# Altium footprint library Item_pcb.PcbLib: 282 footprints (part 13 of 18)
Each footprint in its own frame and in the unit in brackets; x right, y up, seen from the top. Pads: shape width x height; smd on the part's side, far side on the other; paste and mask are expansions set on the pad; w line width, h text height; cw(c..) or ccw(c..) is an arc to the next point about the centre after c.
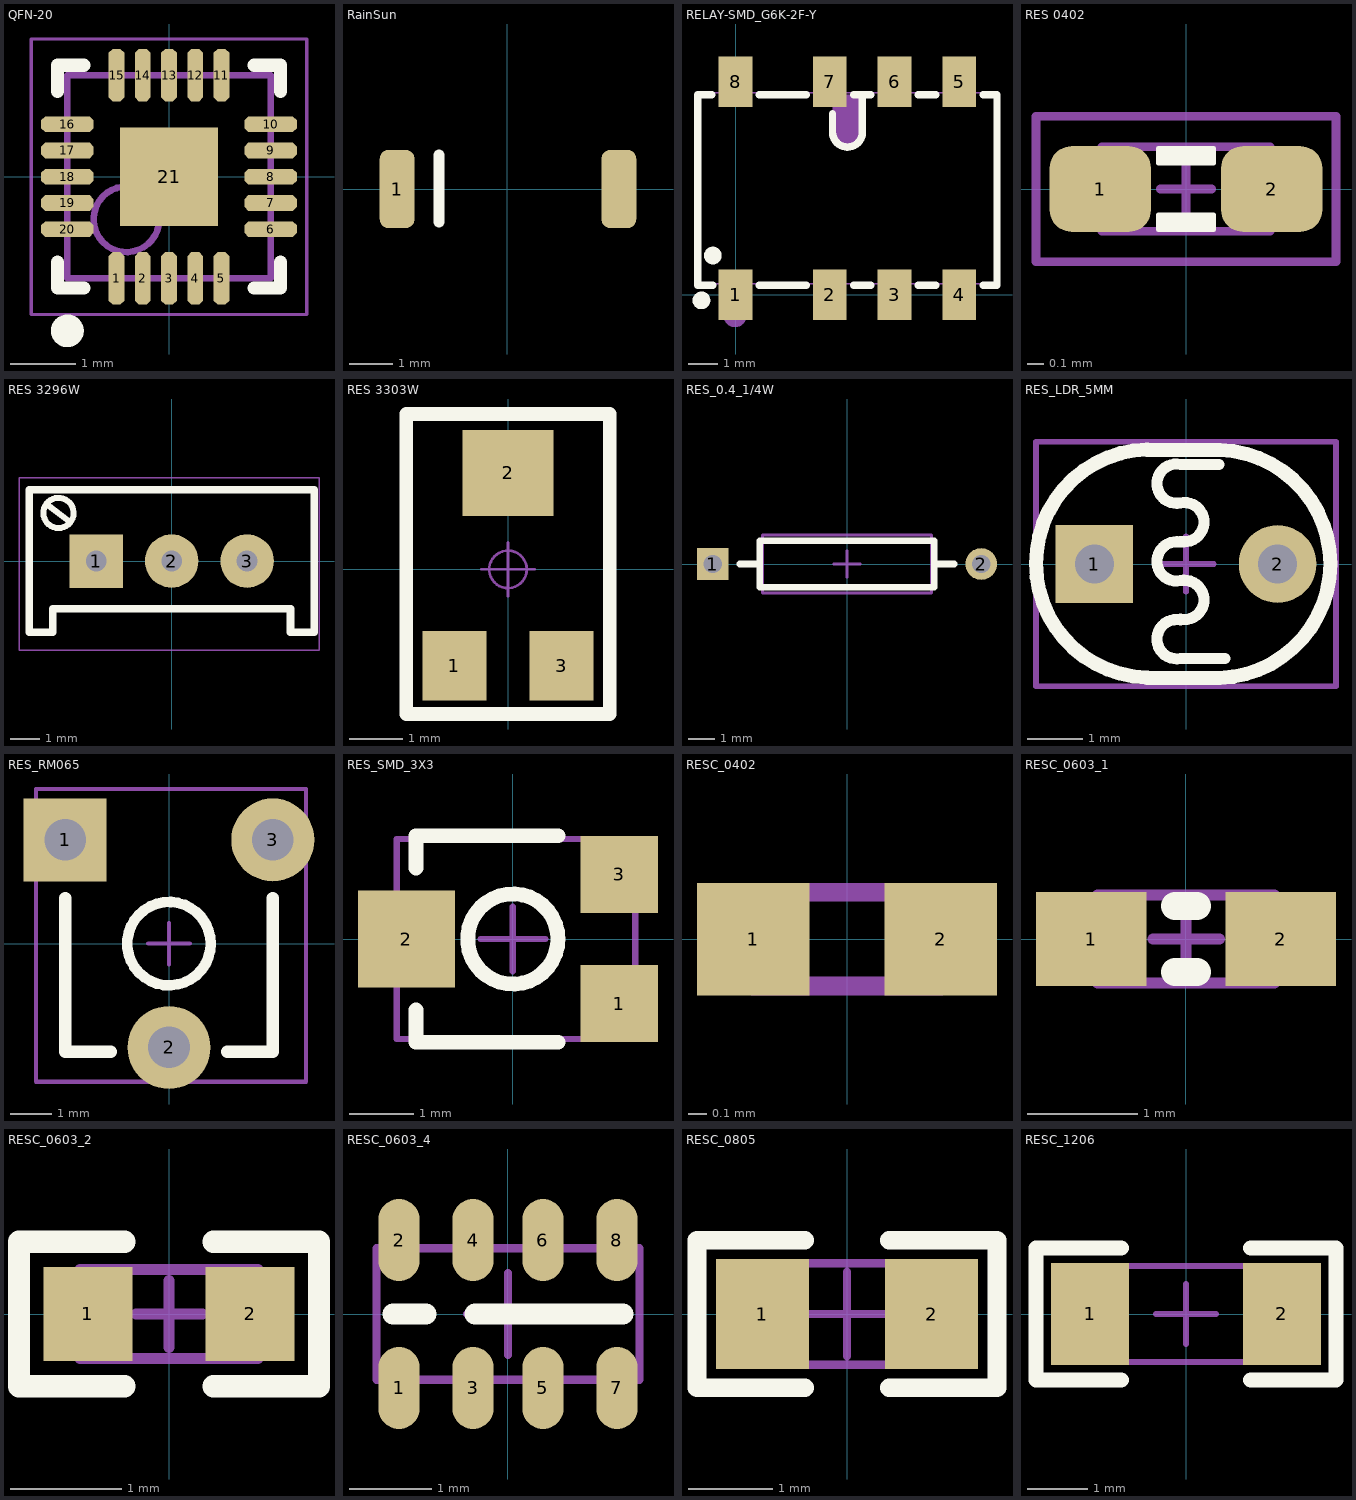
[diagram p12: the footprints below, top view; thin cyan lines are the x and y axes]

## QFN-20 [mm] "3*3MM"
pads (21):
  oct 0.24x0.8 smd: 1(-0.8,-1.55) 2(-0.4,-1.55) 3(0,-1.55) 4(0.4,-1.55) 5(0.8,-1.55) 11(0.8,1.55) 12(0.4,1.55) 13(0,1.55) 14(-0.4,1.55) 15(-0.8,1.55)
  oct 0.8x0.24 smd: 6(1.55,-0.8) 7(1.55,-0.4) 8(1.55,0) 9(1.55,0.4) 10(1.55,0.8) 16(-1.55,0.8) 17(-1.55,0.4) 18(-1.55,0) 19(-1.55,-0.4) 20(-1.55,-0.8)
  rect 1.5x1.5 smd: 21(0,0)
Top Overlay:
  circle w0.25: c-1.55,-2.35 r0.125
  lines w0.2: -1.7,-1.3 -1.7,-1.7 -1.3,-1.7 ; -1.7,1.3 -1.7,1.7 -1.3,1.7 ; 1.3,-1.7 1.7,-1.7 1.7,-1.3 ; 1.3,1.7 1.7,1.7 1.7,1.3
Mechanical 13:
  circle w0.1: c-0.65,-0.65 r0.5
  lines w0.1: -1.55,-1.55 -1.55,1.55 1.55,1.55 1.55,-1.55 -1.55,-1.55
Mechanical 15:
  lines w0.05: -2.1,-2.1 -2.1,2.1 2.1,2.1 2.1,-2.1 -2.1,-2.1
  lines w0.1: -0.5,0 0.5,0 ; 0,-0.5 0,0.5
3D body "QFN40P300X300X80_HS-21N.step": height 0.8, standoff 0, extent -1.56,-1.56 1.56,1.56

## RainSun [mm] "天线"
pads (2):
  rrect50% 0.8x1.8 smd: 1(-2.54,0) ""(2.563,0)
Top Overlay:
  lines w0.254: -1.575,-0.762 -1.575,0.788
3D body "123.stp": height 1.32, standoff -0.01, extent -2.573,-0.911 2.542,0.935

## RELAY-SMD_G6K-2F-Y [mm] "JDQ"
pads (8):
  rect 1.15x1.7 smd: 1(0,0) 2(3.2,0) 3(5.4,0) 4(7.6,0) 5(7.6,7.235) 6(5.4,7.235) 7(3.2,7.235) 8(0,7.235)
Top Overlay:
  circle w0.3: c-1.161,-0.192 r0.15
  circle w0.3: c-0.772,1.332 r0.15
  lines w0.254: -0.806,6.793 -1.28,6.793 -1.28,0.443 -1.28,0.316 -0.772,0.316 ; 0.806,0.316 2.394,0.316 ; 0.806,6.793 2.394,6.793 ; 3.292,6.154 3.292,5.523 ccw(c3.8,5.523) 3.8,5.015 ccw(c3.8,5.523) 4.308,5.523 4.308,6.666 ; 4.006,0.316 4.594,0.316 ; 4.006,6.793 4.594,6.793 ; 6.206,0.316 6.794,0.316 ; 6.206,6.793 6.794,6.793 ; 8.406,0.316 8.88,0.316 8.88,6.793 8.406,6.793
Mechanical 6:
  circle w0.4: c-0.018,-0.7 r0.2
  region: 3.8,5.015 3.699,5.015 3.512,5.092 3.369,5.235 3.292,5.422 3.292,5.523 3.292,6.793 4.308,6.793 4.308,5.523 4.308,5.422 4.231,5.235 4.088,5.092 3.901,5.015
Mechanical 15:
  region: -0.25,-0.282 -0.25,0.218 0.25,0.218 0.25,-0.282
  region: -0.25,0.208 -0.25,0.378 0.25,0.378 0.25,0.208
  region: 2.95,-0.282 2.95,0.218 3.45,0.218 3.45,-0.282
  region: 2.95,0.208 2.95,0.378 3.45,0.378 3.45,0.208
  region: 5.15,-0.282 5.15,0.218 5.65,0.218 5.65,-0.282
  region: 5.15,0.208 5.15,0.378 5.65,0.378 5.65,0.208
  region: 7.35,-0.282 7.35,0.218 7.85,0.218 7.85,-0.282
  region: 7.35,0.208 7.35,0.378 7.85,0.378 7.85,0.208
  region: -0.25,7.018 -0.25,7.518 0.25,7.518 0.25,7.018
  region: -0.25,6.858 -0.25,7.028 0.25,7.028 0.25,6.858
  region: 2.95,7.018 2.95,7.518 3.45,7.518 3.45,7.018
  region: 2.95,6.858 2.95,7.028 3.45,7.028 3.45,6.858
  region: 5.15,7.018 5.15,7.518 5.65,7.518 5.65,7.018
  region: 5.15,6.858 5.15,7.028 5.65,7.028 5.65,6.858
  region: 7.35,7.018 7.35,7.518 7.85,7.518 7.85,7.018
  region: 7.35,6.858 7.35,7.028 7.85,7.028 7.85,6.858
  region: -1.14,-0.282 -1.141,-0.258 -1.176,-0.224 -1.225,-0.224 -1.259,-0.258 -1.26,-0.282 -1.259,-0.307 -1.224,-0.341 -1.175,-0.341 -1.141,-0.307
  lines w0.051: -1.2,0.368 8.8,0.368 8.8,6.868 -1.2,6.868 -1.2,0.368
3D body "3D_PCB2_2024-03-27-G6K_end.STEP": height 5.48, standoff 0.1, extent -1.19,-0.254 8.81,7.546

## RES 0402 [mil]
pads (2):
  rrect50% 23.62x20 smd: 1(-20,0) 2(20,0)
Top Overlay:
  region: 6.5,-9.5 -6.5,-9.5 -6.5,-6 6.5,-6
  region: -6.5,9.5 6.5,9.5 6.5,6 -6.5,6
  lines w1: -6.5,-9.5 6.5,-9.5 6.5,-6 -6.5,-6 -6.5,-9.5 ; -6.5,6 -6.5,9.5 6.5,9.5 6.5,6 -6.5,6
Mechanical 13:
  lines w2: -6,0 6,0 ; 0,-6 0,6 ; -19.69,-9.84 -19.69,9.84 19.68,9.84 19.68,-9.84 -19.69,-9.84
Mechanical 14:
  lines w2: -35,-17 35,-17 35,17 -35,17 -35,-17
3D body "RESC1005X03L.step": height 13.78, standoff 0, extent -19.68,-9.84 19.69,9.85

## RES 3296W [mm] "Precise Multi-Winding Adjustable Resistor"
pads (3):
  rect 1.8x1.8 hole 0.7: 1(-2.54,0)
  round 1.8 hole 0.7: 2(0,0) 3(2.54,0)
Top Overlay:
  lines w0.2: -3.302,1.651 ccw(c-3.81,1.618) -3.301,1.608
  lines w0.203: -4.2,1.9 -3.464,1.348
  lines w0.254: -4.8,-2.4 -4.8,2.4 4.8,2.4 4.8,-2.4 4,-2.4 4,-1.6 -4,-1.6 -4,-2.4 -4.8,-2.4
Mechanical 15:
  lines w0.05: -5.14,-3 4.96,-3 4.96,2.8 -5.14,2.8 -5.14,-3
3D body "3296.STEP": height 11.52, standoff -3.48, extent -4.75,-2.4 4.75,2.4

## RES 3303W [mm] "3.5*3.1*1.5mm"
pads (3):
  rect 1.2x1.3 smd: 1(-1,-1.8) 3(1,-1.8)
  rect 1.7x1.6 smd: 2(0,1.8)
Top Overlay:
  lines w0.254: -1.9,-2.7 -1.9,2.9 1.9,2.9 1.9,-2.7 -1.9,-2.7
Mechanical 15:
  circle w0.05: c0,0 r0.35
  lines w0.05: -0.5,0 0.5,0 ; 0,-0.5 0,0.5
3D body "3303W.STEP": height 1.45, standoff -0.01, extent -1.55,-2.055 1.55,2.05

## RES_0.4_1/4W [mm]
pads (2):
  rect 1.2x1.2 hole 0.7: 1(-5.08,0)
  round 1.2 hole 0.7: 2(5.08,0)
Top Overlay:
  lines w0.254: -4.064,0 -3.3,0 ; 3.3,0 4.064,0 ; -3.3,-0.875 3.3,-0.875 3.3,0.875 -3.3,0.875 -3.3,-0.875
Mechanical 15:
  lines w0.1: -0.5,0 0.5,0 ; 0,-0.5 0,0.5 ; -3.2,-1.1 3.2,-1.1 3.2,1.1 -3.2,1.1 -3.2,-1.1
3D body "AXIAL0.4.STEP": height 2.56, standoff -2.7, extent -5.385,-1.25 5.375,1.27

## RES_LDR_5MM [mm]
pads (2):
  rect 1.4x1.4 hole 0.7: 1(-1.65,0)
  round 1.4 hole 0.7: 2(1.65,0)
Top Overlay:
  lines w0.2: -0.1,-1.007 ccw(c-0.169,-1.353) -0.1,-1.7 0.7,-1.7 ; -0.1,-0.993 ccw(c-0.031,-0.647) -0.1,-0.3 cw(c-0.169,0.047) -0.1,0.393 ; -0.1,0.407 ccw(c-0.031,0.753) -0.1,1.1 cw(c-0.169,1.447) -0.1,1.793 0.593,1.793
  lines w0.254: -0.703,-2.044 cw(c-0.645,0.009) -0.7,2.063 ; -0.697,-2.05 0.6,-2.05 ccw(c0.545,0.002) 0.604,2.053 -0.69,2.053
Mechanical 15:
  lines w0.1: -0.5,0 0.5,0 ; 0,-0.5 0,0.5 ; -2.7,-2.2 2.7,-2.2 2.7,2.2 -2.7,2.2 -2.7,-2.2
3D body "RESPart7.step": height 2.34, standoff -2.4, extent -2.605,-2.16 2.605,2.14

## RES_RM065 [mm]
pads (3):
  rect 2x2 hole 1: 1(-2.5,2.5)
  round 2 hole 1: 2(0,-2.5) 3(2.5,2.5)
Top Overlay:
  circle w0.254: c0,0 r1.005
  lines w0.3: -2.5,1.1 -2.5,-2.6 -1.4,-2.6 ; 1.4,-2.6 2.5,-2.6 2.5,1.1
Mechanical 15:
  lines w0.1: -0.5,0 0.5,0 ; 0,-0.5 0,0.5 ; -3.2,-3.325 -3.2,3.725 3.3,3.725 3.3,-3.325 -3.2,-3.325
3D body "RESVAR.STEP": height 7.5, standoff -3.4, extent -3.2,-3.325 3.3,3.725

## RES_SMD_3X3 [mm]
pads (3):
  rect 1.2x1.2 smd: 1(1.65,-1) 3(1.65,1)
  rect 1.5x1.5 smd: 2(-1.65,0)
Top Overlay:
  circle w0.23: c0,0 r0.7
  lines w0.23: -1.5,-1.1 -1.5,-1.6 0.7,-1.6 ; -1.5,1.1 -1.5,1.6 0.7,1.6
Mechanical 15:
  lines w0.1: -0.5,0 0.5,0 ; 0,-0.5 0,0.5 ; -1.8,-1.55 -1.8,1.55 1.9,1.55 1.9,-1.55 -1.8,-1.55
3D body "Res-Adj-PVZ3A.STEP": height 1.95, standoff 0, extent -1.795,-1.55 1.895,1.55

## RESC_0402 [mm]
pads (2):
  rect 0.6x0.6 smd mask+0.051: 1(-0.5,0) 2(0.5,0)
Mechanical 15:
  lines w0.1: -0.5,-0.25 -0.5,0.25 0.5,0.25 0.5,-0.25 -0.5,-0.25
3D body "RESC1005(0402).STEP": height 0.38, standoff 0, extent -0.5,-0.25 0.5,0.25

## RESC_0603_1 [mm]
pads (2):
  rect 1x0.85 smd: 1(-0.857,0) 2(0.857,0)
Top Overlay:
  lines w0.254: -0.1,-0.3 0.1,-0.3 ; -0.1,0.3 0.1,0.3
Mechanical 15:
  lines w0.1: -0.297,0 0.303,0 ; 0,-0.3 0,0.3 ; -0.8,-0.4 0.8,-0.4 0.8,0.4 -0.8,0.4 -0.8,-0.4
3D body "RESC1608(0603).STEP": height 0.38, standoff 0, extent -0.8,-0.4 0.8,0.4

## RESC_0603_2 [mm]
pads (2):
  rect 0.8x0.85 smd: 1(-0.73,0) 2(0.73,0)
Top Overlay:
  lines w0.2: -0.4,-0.65 -1.35,-0.65 -1.35,0.65 -0.4,0.65 ; 0.4,-0.65 1.35,-0.65 1.35,0.65 0.4,0.65
Mechanical 15:
  lines w0.1: -0.297,0 0.303,0 ; 0,-0.3 0,0.3 ; -0.8,-0.4 0.8,-0.4 0.8,0.4 -0.8,0.4 -0.8,-0.4
3D body "RESC1608(0603).STEP": height 0.38, standoff 0, extent -0.8,-0.4 0.8,0.4

## RESC_0603_4 [mm]
pads (8):
  oval 0.5x1 smd: 1(-1.327,-0.9) 2(-1.327,0.9) 3(-0.425,-0.9) 4(-0.425,0.9) 5(0.425,-0.9) 6(0.425,0.9) 7(1.327,-0.9) 8(1.327,0.9)
Top Overlay:
  lines w0.254: -1.4,0 -1,0 ; -0.4,0 1.4,0
Mechanical 15:
  lines w0.1: -0.5,0 0.5,0 ; 0,-0.5 0,0.5 ; -1.6,-0.8 -1.6,0.8 1.6,0.8 1.6,-0.8 -1.6,-0.8
3D body "1206-4Way.STEP": height 0.5, standoff 0, extent -1.6,-0.8 1.6,0.8

## RESC_0805 [mm]
pads (2):
  rect 1.1x1.3 smd: 1(-1,0) 2(1,0)
Top Overlay:
  lines w0.22: -0.5,-0.875 -1.775,-0.875 -1.775,0.875 -0.5,0.875 ; 0.5,-0.875 1.775,-0.875 1.775,0.875 0.5,0.875
Mechanical 15:
  lines w0.1: -0.5,0 0.5,0 ; 0,-0.5 0,0.5 ; -1,-0.6 -1,0.6 1,0.6 1,-0.6 -1,-0.6
3D body "RESC2012(0805).STEP": height 0.5, standoff 0, extent -1,-0.6 1,0.6

## RESC_1206 [mm]
pads (2):
  rect 1.3x1.7 smd: 1(-1.6,0) 2(1.6,0)
Top Overlay:
  lines w0.254: -1.079,-1.1 -2.5,-1.1 -2.5,1.1 -1.079,1.1 ; 1.08,-1.1 2.5,-1.1 2.5,1.1 1.08,1.1
Mechanical 15:
  lines w0.1: -0.5,0 0.5,0 ; 0,-0.5 0,0.5 ; -1.6,-0.8 1.6,-0.8 1.6,0.8 -1.6,0.8 -1.6,-0.8
3D body "RESC3216(1206).STEP": height 0.6, standoff 0, extent -1.6,-0.8 1.6,0.8